# Altium footprint library Dip Switch.PcbLib: 39 footprints (part 3 of 3)
Each footprint in its own frame and in the unit in brackets; x right, y up, seen from the top. Pads: shape width x height; smd on the part's side, far side on the other; paste and mask are expansions set on the pad; w line width, h text height; cw(c..) or ccw(c..) is an arc to the next point about the centre after c.
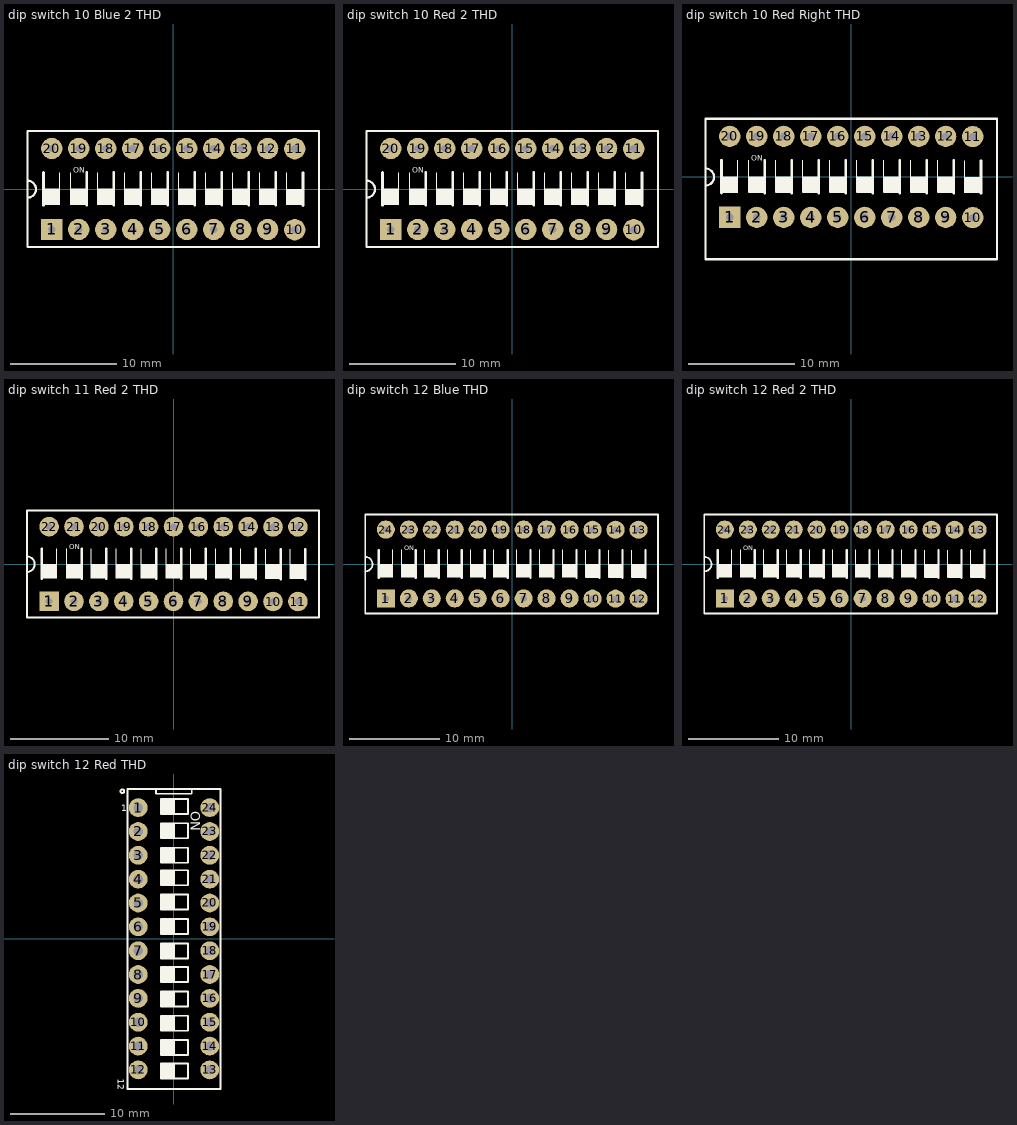
[diagram p2: the footprints below, top view; thin cyan lines are the x and y axes]

## dip switch 10 Blue 2 THD [mm]
height 6.5
pads (20):
  rect 2x2 / inner rect 1.5x2.5 / far side rect 2x2 hole 0.7: 1(-11.432,-3.799)
  round 2 / inner oval 1.5x2.5 / far side round 2 hole 0.7: 2(-8.892,-3.799) 3(-6.352,-3.799) 4(-3.812,-3.799) 5(-1.272,-3.799) 6(1.268,-3.799) 7(3.808,-3.799) 8(6.348,-3.799) 9(8.888,-3.799) 10(11.432,-3.821) 11(11.432,3.799) 12(8.888,3.821) 13(6.348,3.821) 14(3.808,3.821) 15(1.268,3.821) 16(-1.272,3.821) 17(-3.812,3.821) 18(-6.352,3.821) 19(-8.892,3.821) 20(-11.432,3.821)
Top Overlay:
  region: 12.218,-1.511 12.218,0.014 10.662,0.014 10.662,-1.511
  region: 9.674,-1.489 9.674,0.036 8.118,0.036 8.118,-1.489
  region: 7.134,-1.489 7.134,0.036 5.578,0.036 5.578,-1.489
  region: -0.486,-1.489 -0.486,0.036 -2.042,0.036 -2.042,-1.489
  region: -3.026,-1.489 -3.026,0.036 -4.582,0.036 -4.582,-1.489
  region: -5.566,-1.489 -5.566,0.036 -7.122,0.036 -7.122,-1.489
  region: -8.106,-1.489 -8.106,0.036 -9.662,0.036 -9.662,-1.489
  region: -10.656,-1.489 -10.656,0.036 -12.212,0.036 -12.212,-1.489
  region: 4.594,-1.489 4.594,0.036 3.038,0.036 3.038,-1.489
  region: 2.054,-1.489 2.054,0.036 0.498,0.036 0.498,-1.489
  lines w0.1: -10.672,-1.459 -10.672,1.561 ; -9.652,-1.459 -9.652,1.561 ; -7.112,-1.459 -7.112,1.561 ; -4.572,-1.459 -4.572,1.561 ; -2.032,-1.459 -2.032,1.561 ; 0.508,-1.459 0.508,1.561 ; 3.048,-1.459 3.048,1.561 ; 5.588,-1.459 5.588,1.561 ; 8.128,-1.459 8.128,1.561 ; 10.672,-1.481 10.672,1.539
  lines w0.2: -13.712,-0.807 ccw(c-13.712,-0.007) -13.712,0.793 ; -13.712,-5.45 -13.712,5.472 13.714,5.472 13.714,-5.45 -13.712,-5.45
  lines w0.25: -8.122,-1.513 -8.122,1.561 ; -5.582,-1.513 -5.582,1.561 ; -3.042,-1.513 -3.042,1.561 ; -0.502,-1.513 -0.502,1.561 ; 2.038,-1.513 2.038,1.561 ; 4.578,-1.513 4.578,1.561 ; 7.118,-1.513 7.118,1.561 ; 9.658,-1.513 9.658,1.561 ; 12.202,-1.535 12.202,1.539
  lines w0.254: -12.212,-1.513 -12.212,1.561
  text "ON" at -9.4,1.535 h0.51
3D body "User Library-DIP SWITCH 10 POS CTS 206.step": height 8.25, standoff -3.5, extent -13.719,-4.878 13.861,4.902

## dip switch 10 Red 2 THD [mm]
height 6.5
pads (20):
  rect 2x2 hole 0.7: 1(-11.432,-3.799)
  round 2 hole 0.7: 2(-8.892,-3.799) 3(-6.352,-3.799) 4(-3.812,-3.799) 5(-1.272,-3.799) 6(1.268,-3.799) 7(3.808,-3.799) 8(6.348,-3.799) 9(8.888,-3.799) 10(11.432,-3.821) 11(11.432,3.799) 12(8.888,3.821) 13(6.348,3.821) 14(3.808,3.821) 15(1.268,3.821) 16(-1.272,3.821) 17(-3.812,3.821) 18(-6.352,3.821) 19(-8.892,3.821) 20(-11.432,3.821)
Top Overlay:
  region: 2.054,-1.489 2.054,0.036 0.498,0.036 0.498,-1.489
  region: 4.594,-1.489 4.594,0.036 3.038,0.036 3.038,-1.489
  region: -10.656,-1.489 -10.656,0.036 -12.212,0.036 -12.212,-1.489
  region: -8.106,-1.489 -8.106,0.036 -9.662,0.036 -9.662,-1.489
  region: -5.566,-1.489 -5.566,0.036 -7.122,0.036 -7.122,-1.489
  region: -3.026,-1.489 -3.026,0.036 -4.582,0.036 -4.582,-1.489
  region: -0.486,-1.489 -0.486,0.036 -2.042,0.036 -2.042,-1.489
  region: 7.134,-1.489 7.134,0.036 5.578,0.036 5.578,-1.489
  region: 9.674,-1.489 9.674,0.036 8.118,0.036 8.118,-1.489
  region: 12.218,-1.511 12.218,0.014 10.662,0.014 10.662,-1.511
  lines w0.1: -10.672,-1.459 -10.672,1.561 ; -9.652,-1.459 -9.652,1.561 ; -7.112,-1.459 -7.112,1.561 ; -4.572,-1.459 -4.572,1.561 ; -2.032,-1.459 -2.032,1.561 ; 0.508,-1.459 0.508,1.561 ; 3.048,-1.459 3.048,1.561 ; 5.588,-1.459 5.588,1.561 ; 8.128,-1.459 8.128,1.561 ; 10.672,-1.481 10.672,1.539
  lines w0.2: -13.712,-0.807 ccw(c-13.712,-0.007) -13.712,0.793 ; -13.712,-5.45 13.714,-5.45 13.714,5.472 -13.712,5.472 -13.712,-5.45
  lines w0.25: -8.122,-1.513 -8.122,1.561 ; -5.582,-1.513 -5.582,1.561 ; -3.042,-1.513 -3.042,1.561 ; -0.502,-1.513 -0.502,1.561 ; 2.038,-1.513 2.038,1.561 ; 4.578,-1.513 4.578,1.561 ; 7.118,-1.513 7.118,1.561 ; 9.658,-1.513 9.658,1.561 ; 12.202,-1.535 12.202,1.539
  lines w0.254: -12.212,-1.513 -12.212,1.561
  text "ON" at -9.4,1.535 h0.51
3D body "User Library-DS1040-10 (DIP_switch).step": height 6.8, standoff -3.85, extent -13.419,-4.975 13.441,4.925

## dip switch 10 Red Right THD [mm]
height 6.5
pads (20):
  rect 2x2 / inner rect 1.5x2.5 / far side rect 2x2 hole 0.7: 1(-11.432,-3.799)
  round 2 / inner oval 1.5x2.5 / far side round 2 hole 0.7: 2(-8.892,-3.799) 3(-6.352,-3.799) 4(-3.812,-3.799) 5(-1.272,-3.799) 6(1.268,-3.799) 7(3.808,-3.799) 8(6.348,-3.799) 9(8.888,-3.799) 10(11.432,-3.821) 11(11.432,3.799) 12(8.888,3.821) 13(6.348,3.821) 14(3.808,3.821) 15(1.268,3.821) 16(-1.272,3.821) 17(-3.812,3.821) 18(-6.352,3.821) 19(-8.892,3.821) 20(-11.432,3.821)
Top Overlay:
  region: 2.054,-1.489 2.054,0.036 0.498,0.036 0.498,-1.489
  region: 4.594,-1.489 4.594,0.036 3.038,0.036 3.038,-1.489
  region: -10.656,-1.489 -10.656,0.036 -12.212,0.036 -12.212,-1.489
  region: -8.106,-1.489 -8.106,0.036 -9.662,0.036 -9.662,-1.489
  region: -5.566,-1.489 -5.566,0.036 -7.122,0.036 -7.122,-1.489
  region: -3.026,-1.489 -3.026,0.036 -4.582,0.036 -4.582,-1.489
  region: -0.486,-1.489 -0.486,0.036 -2.042,0.036 -2.042,-1.489
  region: 7.134,-1.489 7.134,0.036 5.578,0.036 5.578,-1.489
  region: 9.674,-1.489 9.674,0.036 8.118,0.036 8.118,-1.489
  region: 12.218,-1.511 12.218,0.014 10.662,0.014 10.662,-1.511
  lines w0.1: -10.672,-1.459 -10.672,1.561 ; -9.652,-1.459 -9.652,1.561 ; -7.112,-1.459 -7.112,1.561 ; -4.572,-1.459 -4.572,1.561 ; -2.032,-1.459 -2.032,1.561 ; 0.508,-1.459 0.508,1.561 ; 3.048,-1.459 3.048,1.561 ; 5.588,-1.459 5.588,1.561 ; 8.128,-1.459 8.128,1.561 ; 10.672,-1.481 10.672,1.539
  lines w0.2: -13.712,-0.807 ccw(c-13.712,-0.007) -13.712,0.793 ; -13.712,-7.736 13.714,-7.736 13.714,5.472 -13.712,5.472 -13.712,-7.736
  lines w0.25: -8.122,-1.513 -8.122,1.561 ; -5.582,-1.513 -5.582,1.561 ; -3.042,-1.513 -3.042,1.561 ; -0.502,-1.513 -0.502,1.561 ; 2.038,-1.513 2.038,1.561 ; 4.578,-1.513 4.578,1.561 ; 7.118,-1.513 7.118,1.561 ; 9.658,-1.513 9.658,1.561 ; 12.202,-1.535 12.202,1.539
  lines w0.254: -12.212,-1.513 -12.212,1.561
  text "ON" at -9.4,1.535 h0.51
3D body "User Library-DIP-Switch-10P (1).step": height 9.5, standoff -3.5, extent -13.482,-7.545 13.478,4.955

## dip switch 11 Red 2 THD [mm]
height 6.5
pads (22):
  rect 2x2 / inner rect 1.5x2.5 / far side rect 2x2 hole 0.7: 1(-12.702,-3.799)
  round 2 / inner oval 1.5x2.5 / far side round 2 hole 0.7: 2(-10.162,-3.799) 3(-7.622,-3.799) 4(-5.082,-3.799) 5(-2.542,-3.799) 6(-0.002,-3.799) 7(2.538,-3.799) 8(5.078,-3.799) 9(7.618,-3.799) 10(10.162,-3.821) 11(12.702,-3.821) 12(12.702,3.799) 13(10.162,3.799) 14(7.618,3.821) 15(5.078,3.821) 16(2.538,3.821) 17(-0.002,3.821) 18(-2.542,3.821) 19(-5.082,3.821) 20(-7.622,3.821) 21(-10.162,3.821) 22(-12.702,3.821)
Top Overlay:
  region: 10.948,-1.511 10.948,0.014 9.392,0.014 9.392,-1.511
  region: 8.404,-1.489 8.404,0.036 6.848,0.036 6.848,-1.489
  region: 5.864,-1.489 5.864,0.036 4.308,0.036 4.308,-1.489
  region: -1.756,-1.489 -1.756,0.036 -3.312,0.036 -3.312,-1.489
  region: -4.296,-1.489 -4.296,0.036 -5.852,0.036 -5.852,-1.489
  region: -6.836,-1.489 -6.836,0.036 -8.392,0.036 -8.392,-1.489
  region: -9.376,-1.489 -9.376,0.036 -10.932,0.036 -10.932,-1.489
  region: -11.926,-1.489 -11.926,0.036 -13.482,0.036 -13.482,-1.489
  region: 3.324,-1.489 3.324,0.036 1.768,0.036 1.768,-1.489
  region: 0.784,-1.489 0.784,0.036 -0.772,0.036 -0.772,-1.489
  region: 13.488,-1.511 13.488,0.014 11.932,0.014 11.932,-1.511
  lines w0.1: -11.942,-1.459 -11.942,1.561 ; -10.922,-1.459 -10.922,1.561 ; -8.382,-1.459 -8.382,1.561 ; -5.842,-1.459 -5.842,1.561 ; -3.302,-1.459 -3.302,1.561 ; -0.762,-1.459 -0.762,1.561 ; 1.778,-1.459 1.778,1.561 ; 4.318,-1.459 4.318,1.561 ; 6.858,-1.459 6.858,1.561 ; 9.402,-1.481 9.402,1.539 ; 11.942,-1.481 11.942,1.539
  lines w0.2: -14.982,-0.807 ccw(c-14.982,-0.007) -14.982,0.793 ; -14.982,-5.45 -14.982,5.472 14.857,5.472 14.857,-5.45 -14.982,-5.45
  lines w0.25: -9.392,-1.513 -9.392,1.561 ; -6.852,-1.513 -6.852,1.561 ; -4.312,-1.513 -4.312,1.561 ; -1.772,-1.513 -1.772,1.561 ; 0.768,-1.513 0.768,1.561 ; 3.308,-1.513 3.308,1.561 ; 5.848,-1.513 5.848,1.561 ; 8.388,-1.513 8.388,1.561 ; 10.932,-1.535 10.932,1.539 ; 13.472,-1.535 13.472,1.539
  lines w0.254: -13.482,-1.513 -13.482,1.561
  text "ON" at -10.67,1.535 h0.51
3D body "User Library-DS1040-11 (DIP_switch).step": height 6.8, standoff -3.85, extent -14.702,-4.937 14.698,4.964

## dip switch 12 Blue THD [mm]
height 6.5
pads (24):
  rect 2x2 / inner rect 1.5x2.5 / far side rect 2x2 hole 0.7: 1(-13.972,-3.799)
  round 2 / inner oval 1.5x2.5 / far side round 2 hole 0.7: 2(-11.432,-3.799) 3(-8.892,-3.799) 4(-6.352,-3.799) 5(-3.812,-3.799) 6(-1.272,-3.799) 7(1.268,-3.799) 8(3.808,-3.799) 9(6.348,-3.799) 10(8.892,-3.821) 11(11.432,-3.821) 12(13.972,-3.821) 13(13.972,3.799) 14(11.432,3.799) 15(8.892,3.799) 16(6.348,3.821) 17(3.808,3.821) 18(1.268,3.821) 19(-1.272,3.821) 20(-3.812,3.821) 21(-6.352,3.821) 22(-8.892,3.821) 23(-11.432,3.821) 24(-13.972,3.821)
Top Overlay:
  region: 12.218,-1.511 12.218,0.014 10.662,0.014 10.662,-1.511
  region: -0.486,-1.489 -0.486,0.036 -2.042,0.036 -2.042,-1.489
  region: 2.054,-1.489 2.054,0.036 0.498,0.036 0.498,-1.489
  region: -13.196,-1.489 -13.196,0.036 -14.752,0.036 -14.752,-1.489
  region: -10.646,-1.489 -10.646,0.036 -12.202,0.036 -12.202,-1.489
  region: -8.106,-1.489 -8.106,0.036 -9.662,0.036 -9.662,-1.489
  region: -5.566,-1.489 -5.566,0.036 -7.122,0.036 -7.122,-1.489
  region: -3.026,-1.489 -3.026,0.036 -4.582,0.036 -4.582,-1.489
  region: 4.594,-1.489 4.594,0.036 3.038,0.036 3.038,-1.489
  region: 7.134,-1.489 7.134,0.036 5.578,0.036 5.578,-1.489
  region: 9.678,-1.511 9.678,0.014 8.122,0.014 8.122,-1.511
  region: 14.758,-1.511 14.758,0.014 13.202,0.014 13.202,-1.511
  lines w0.1: -13.212,-1.459 -13.212,1.561 ; -12.192,-1.459 -12.192,1.561 ; -9.652,-1.459 -9.652,1.561 ; -7.112,-1.459 -7.112,1.561 ; -4.572,-1.459 -4.572,1.561 ; -2.032,-1.459 -2.032,1.561 ; 0.508,-1.459 0.508,1.561 ; 3.048,-1.459 3.048,1.561 ; 5.588,-1.459 5.588,1.561 ; 8.132,-1.481 8.132,1.539 ; 10.672,-1.481 10.672,1.539 ; 13.212,-1.481 13.212,1.539
  lines w0.2: -16.252,-0.807 ccw(c-16.252,-0.007) -16.252,0.793 ; -16.252,-5.45 16.127,-5.45 16.127,5.472 -16.252,5.472 -16.252,-5.45
  lines w0.25: -10.662,-1.513 -10.662,1.561 ; -8.122,-1.513 -8.122,1.561 ; -5.582,-1.513 -5.582,1.561 ; -3.042,-1.513 -3.042,1.561 ; -0.502,-1.513 -0.502,1.561 ; 2.038,-1.513 2.038,1.561 ; 4.578,-1.513 4.578,1.561 ; 7.118,-1.513 7.118,1.561 ; 9.662,-1.535 9.662,1.539 ; 12.202,-1.535 12.202,1.539 ; 14.742,-1.535 14.742,1.539
  lines w0.254: -14.752,-1.513 -14.752,1.561
  text "ON" at -11.94,1.535 h0.51
3D body "User Library-DIP SWITCH 12 POS CTS 206.step": height 8.25, standoff -3.5, extent -16.332,-4.625 16.328,5.155

## dip switch 12 Red 2 THD [mm]
height 6.5
pads (24):
  rect 2x2 / inner rect 1.5x2.5 / far side rect 2x2 hole 0.7: 1(-13.972,-3.799)
  round 2 / inner oval 1.5x2.5 / far side round 2 hole 0.7: 2(-11.432,-3.799) 3(-8.892,-3.799) 4(-6.352,-3.799) 5(-3.812,-3.799) 6(-1.272,-3.799) 7(1.268,-3.799) 8(3.808,-3.799) 9(6.348,-3.799) 10(8.892,-3.821) 11(11.432,-3.821) 12(13.972,-3.821) 13(13.972,3.799) 14(11.432,3.799) 15(8.892,3.799) 16(6.348,3.821) 17(3.808,3.821) 18(1.268,3.821) 19(-1.272,3.821) 20(-3.812,3.821) 21(-6.352,3.821) 22(-8.892,3.821) 23(-11.432,3.821) 24(-13.972,3.821)
Top Overlay:
  region: 14.758,-1.511 14.758,0.014 13.202,0.014 13.202,-1.511
  region: 9.678,-1.511 9.678,0.014 8.122,0.014 8.122,-1.511
  region: 7.134,-1.489 7.134,0.036 5.578,0.036 5.578,-1.489
  region: 4.594,-1.489 4.594,0.036 3.038,0.036 3.038,-1.489
  region: -3.026,-1.489 -3.026,0.036 -4.582,0.036 -4.582,-1.489
  region: -5.566,-1.489 -5.566,0.036 -7.122,0.036 -7.122,-1.489
  region: -8.106,-1.489 -8.106,0.036 -9.662,0.036 -9.662,-1.489
  region: -10.646,-1.489 -10.646,0.036 -12.202,0.036 -12.202,-1.489
  region: -13.196,-1.489 -13.196,0.036 -14.752,0.036 -14.752,-1.489
  region: 2.054,-1.489 2.054,0.036 0.498,0.036 0.498,-1.489
  region: -0.486,-1.489 -0.486,0.036 -2.042,0.036 -2.042,-1.489
  region: 12.218,-1.511 12.218,0.014 10.662,0.014 10.662,-1.511
  lines w0.1: -13.212,-1.459 -13.212,1.561 ; -12.192,-1.459 -12.192,1.561 ; -9.652,-1.459 -9.652,1.561 ; -7.112,-1.459 -7.112,1.561 ; -4.572,-1.459 -4.572,1.561 ; -2.032,-1.459 -2.032,1.561 ; 0.508,-1.459 0.508,1.561 ; 3.048,-1.459 3.048,1.561 ; 5.588,-1.459 5.588,1.561 ; 8.132,-1.481 8.132,1.539 ; 10.672,-1.481 10.672,1.539 ; 13.212,-1.481 13.212,1.539
  lines w0.2: -16.252,-0.807 ccw(c-16.252,-0.007) -16.252,0.793 ; -16.252,-5.45 -16.252,5.472 16.127,5.472 16.127,-5.45 -16.252,-5.45
  lines w0.25: -10.662,-1.513 -10.662,1.561 ; -8.122,-1.513 -8.122,1.561 ; -5.582,-1.513 -5.582,1.561 ; -3.042,-1.513 -3.042,1.561 ; -0.502,-1.513 -0.502,1.561 ; 2.038,-1.513 2.038,1.561 ; 4.578,-1.513 4.578,1.561 ; 7.118,-1.513 7.118,1.561 ; 9.662,-1.535 9.662,1.539 ; 12.202,-1.535 12.202,1.539 ; 14.742,-1.535 14.742,1.539
  lines w0.254: -14.752,-1.513 -14.752,1.561
  text "ON" at -11.94,1.535 h0.51
3D body "User Library-DS1040-12 (DIP_switch).step": height 6.8, standoff -3.85, extent -15.972,-4.939 15.968,4.961

## dip switch 12 Red THD [mm] "SWITCH DIP 12POS, THD, 2.54mm"
pads (24):
  round 2 / inner round 1.4 / far side round 2 hole 1: 1(-3.81,13.97) 2(-3.81,11.43) 3(-3.81,8.89) 4(-3.81,6.35) 5(-3.81,3.81) 6(-3.81,1.27) 7(-3.81,-1.27) 8(-3.81,-3.81) 9(-3.81,-6.35) 10(-3.81,-8.89) 11(-3.81,-11.43) 12(-3.81,-13.97) 13(3.81,-13.97) 14(3.81,-11.43) 15(3.81,-8.89) 16(3.81,-6.35) 17(3.81,-3.81) 18(3.81,-1.27) 19(3.81,1.27) 20(3.81,3.81) 21(3.81,6.35) 22(3.81,8.89) 23(3.81,11.43) 24(3.81,13.97)
Top Overlay:
  circle w0.2: c-5.5,15.71 r0.2
  rectangle: -1.4,13.3 0.1,14.9
  rectangle: -1.4,10.7 0.1,12.3
  rectangle: -1.4,8.1 0.1,9.7
  rectangle: -1.4,5.7 0.1,7.3
  rectangle: -1.4,3.1 0.1,4.7
  rectangle: -1.4,0.5 0.1,2.1
  rectangle: -1.4,-2.1 0.1,-0.5
  rectangle: -1.4,-4.6 0.1,-3
  rectangle: -1.4,-14.9 0.1,-13.3
  rectangle: -1.4,-12.4 0.1,-10.8
  rectangle: -1.4,-9.8 0.1,-8.2
  rectangle: -1.4,-7.2 0.1,-5.6
  lines w0.2: -1.91,15.951 -1.91,15.443 1.9,15.443 1.9,15.951 ; -4.953,-16.002 4.953,-16.002 4.953,15.951 -4.953,15.951 -4.953,-16.002 ; -1.4,-14.9 1.5,-14.9 1.5,-13.3 -1.4,-13.3 -1.4,-14.9 ; -1.4,-12.4 1.5,-12.4 1.5,-10.8 -1.4,-10.8 -1.4,-12.4 ; -1.4,-9.8 1.5,-9.8 1.5,-8.2 -1.4,-8.2 -1.4,-9.8 ; -1.4,-7.2 1.5,-7.2 1.5,-5.6 -1.4,-5.6 -1.4,-7.2 ; -1.4,-4.6 -1.4,-3 1.5,-3 1.5,-4.6 -1.4,-4.6 ; -1.4,-2.1 -1.4,-0.5 1.5,-0.5 1.5,-2.1 -1.4,-2.1 ; -1.4,0.5 -1.4,2.1 1.5,2.1 1.5,0.5 -1.4,0.5 ; -1.4,3.1 -1.4,4.7 1.5,4.7 1.5,3.1 -1.4,3.1 ; -1.4,5.7 -1.4,7.3 1.5,7.3 1.5,5.7 -1.4,5.7 ; -1.4,8.1 -1.4,9.7 1.5,9.7 1.5,8.1 -1.4,8.1 ; -1.4,10.7 -1.4,12.3 1.5,12.3 1.5,10.7 -1.4,10.7 ; -1.4,13.3 -1.4,14.9 1.5,14.9 1.5,13.3 -1.4,13.3
  text "1" at -5.61,13.57 h0.7
  text "12" at -6.01,-14.93 h0.7
  text "ON" at 1.8,13.6 h1
3D body: height 5.59, standoff 0, extent -1.448,-13.208 1.443,-12.192
3D body: height 5.08, standoff 0.25, extent -0.737,-14.732 1.443,-13.208
3D body: height 6.35, standoff 0.25, extent -1.448,-14.732 -0.737,-13.208
3D body: height 5.59, standoff 0, extent -1.448,-10.668 1.443,-9.652
3D body: height 5.08, standoff 0.25, extent -0.737,-12.192 1.443,-10.668
3D body: height 6.35, standoff 0.25, extent -1.448,-12.192 -0.737,-10.668
3D body: height 5.59, standoff 0, extent -1.448,-8.128 1.443,-7.112
3D body: height 5.08, standoff 0.25, extent -0.737,-9.652 1.443,-8.128
3D body: height 6.35, standoff 0.25, extent -1.448,-9.652 -0.737,-8.128
3D body: height 5.59, standoff 0, extent -1.448,-5.588 1.443,-4.572
3D body: height 5.08, standoff 0.25, extent -0.737,-7.112 1.443,-5.588
3D body: height 6.35, standoff 0.25, extent -1.448,-7.112 -0.737,-5.588
3D body: height 5.59, standoff 0, extent -1.448,-3.048 1.443,-2.032
3D body: height 5.08, standoff 0.25, extent -0.737,-4.572 1.443,-3.048
3D body: height 6.35, standoff 0.25, extent -1.448,-4.572 -0.737,-3.048
3D body: height 5.59, standoff 0, extent -1.448,-0.508 1.443,0.508
3D body: height 5.08, standoff 0.25, extent -0.737,-2.032 1.443,-0.508
3D body: height 6.35, standoff 0.25, extent -1.448,-2.032 -0.737,-0.508
3D body: height 5.59, standoff 0, extent -1.448,2.032 1.443,3.048
3D body: height 5.08, standoff 0.25, extent -0.737,0.508 1.443,2.032
3D body: height 6.35, standoff 0.25, extent -1.448,0.508 -0.737,2.032
3D body: height 5.59, standoff 0, extent -1.448,4.572 1.443,5.588
3D body: height 5.08, standoff 0.25, extent -0.737,3.048 1.443,4.572
3D body: height 6.35, standoff 0.25, extent -1.448,3.048 -0.737,4.572
3D body: height 6.35, standoff 0.25, extent -1.448,10.668 -0.737,12.192
3D body: height 5.08, standoff 0.25, extent -0.737,10.668 1.443,12.192
3D body: height 5.59, standoff 0, extent -1.448,9.652 1.443,10.668
3D body: height 5.59, standoff 0, extent -1.448,7.112 1.443,8.128
3D body: height 5.59, standoff 0, extent -1.448,12.192 1.443,13.208
3D body: height 6.35, standoff 0.25, extent -1.448,5.588 -0.737,7.112
3D body: height 5.08, standoff 0.25, extent -0.737,5.588 1.443,7.112
3D body: height 6.35, standoff 0.25, extent -1.448,8.128 -0.737,9.652
3D body: height 5.08, standoff 0.25, extent -0.737,8.128 1.443,9.652
3D body: height 5.08, standoff 0.25, extent -0.737,13.208 1.443,14.732
3D body: height 6.35, standoff 0.25, extent -1.448,13.208 -0.737,14.732
3D body: height 5.59, standoff 0.25, extent 2.205,11.605 3.757,13.171
3D body: height 5.59, standoff 0.03, extent 2.28,13.716 3.697,14.524
3D body: height 5.59, standoff 0.25, extent 2.195,13.308 3.769,14.926
3D body: height 5.59, standoff 0, extent -1.448,14.732 1.443,15.443
3D body: height 0.25, standoff 0.05, extent -4.953,-16.002 4.953,15.951
3D body: height 5.59, standoff 0, extent -4.953,-16.002 4.953,15.951
3D body: height 3.81, standoff 0, extent -1.91,15.443 1.9,15.951
3D body: height 0.76, standoff 0, extent -4.063,6.097 -3.557,6.603
3D body: height 0.76, standoff 0, extent -4.063,8.637 -3.557,9.143
3D body: height 0.76, standoff 0, extent -4.073,11.177 -3.567,11.683
3D body: height 0.76, standoff 0, extent -4.063,13.717 -3.557,14.223
3D body: height 0.76, standoff 0, extent 3.557,6.097 4.063,6.603
3D body: height 0.76, standoff 0, extent 3.557,8.637 4.063,9.143
3D body: height 0.76, standoff 0, extent 3.557,11.177 4.063,11.683
3D body: height 0.76, standoff 0, extent 3.557,13.717 4.063,14.223
3D body: height 0.76, standoff 0, extent 3.557,-1.523 4.063,-1.017
3D body: height 0.76, standoff 0, extent 3.557,-4.063 4.063,-3.557
3D body: height 0.76, standoff 0, extent 3.557,1.017 4.063,1.523
3D body: height 0.76, standoff 0, extent -4.063,3.557 -3.557,4.063
3D body: height 0.76, standoff 0, extent -4.063,1.017 -3.557,1.523
3D body: height 0.76, standoff 0, extent -4.063,-1.523 -3.557,-1.017
3D body: height 0.76, standoff 0, extent -4.063,-4.063 -3.557,-3.557
3D body: height 0.76, standoff 0, extent -4.063,-6.603 -3.557,-6.097
3D body: height 0.76, standoff 0, extent -4.063,-9.143 -3.557,-8.637
3D body: height 0.76, standoff 0, extent -4.063,-11.683 -3.557,-11.177
3D body: height 0.76, standoff 0, extent -4.063,-14.223 -3.557,-13.717
3D body: height 0.76, standoff 0, extent 3.557,-14.223 4.063,-13.717
3D body: height 0.76, standoff 0, extent 3.557,-11.683 4.063,-11.177
3D body: height 0.76, standoff 0, extent 3.557,-9.143 4.063,-8.637
3D body: height 0.76, standoff 0, extent 3.557,-6.603 4.063,-6.097